# Altium footprint library EXPLORER.PcbLib: 252 footprints (part 10 of 16)
Each footprint in its own frame and in the unit in brackets; x right, y up, seen from the top. Pads: shape width x height; smd on the part's side, far side on the other; paste and mask are expansions set on the pad; w line width, h text height; cw(c..) or ccw(c..) is an arc to the next point about the centre after c.
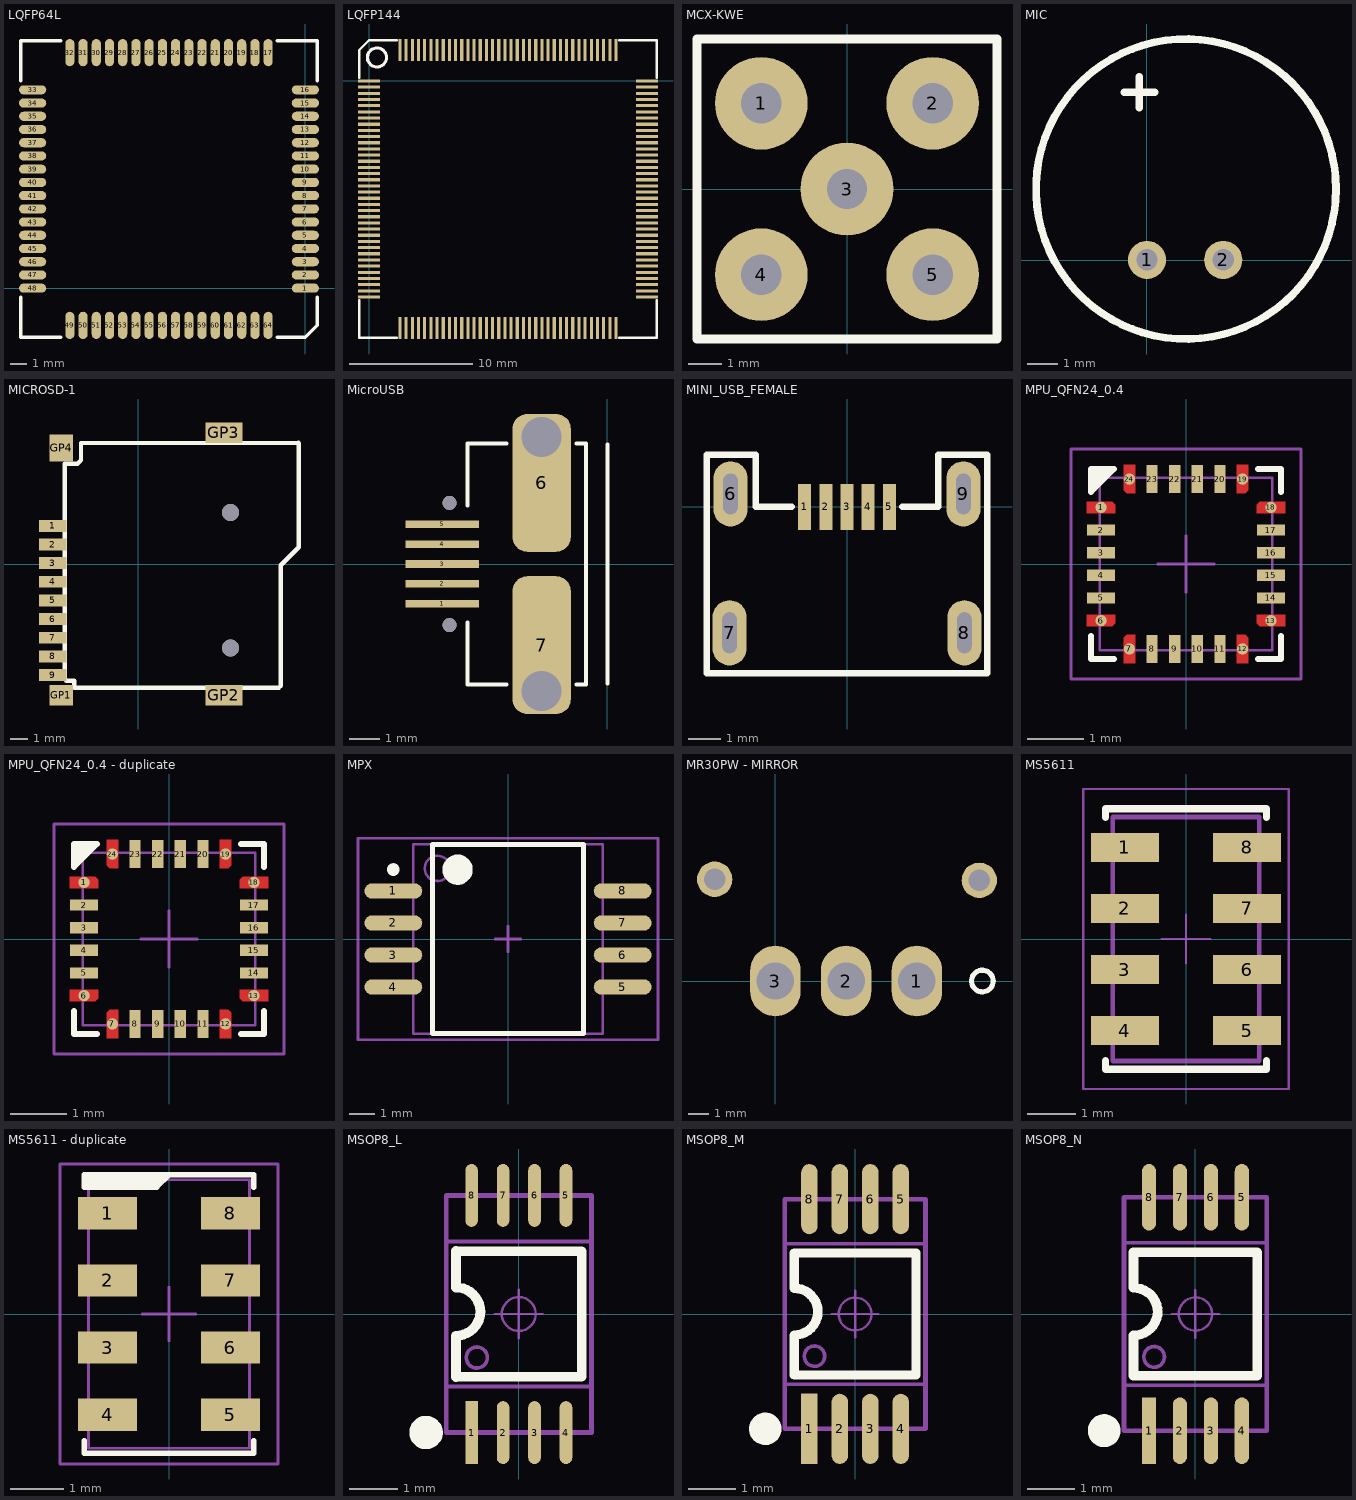
[diagram p9: the footprints below, top view; thin cyan lines are the x and y axes]

## LQFP64L [mm]
height 1.6
pads (64):
  oval 1.65x0.55 smd: 1(0,0) 2(0,0.8) 3(0,1.6) 4(0,2.4) 5(0,3.2) 6(0,4) 7(0,4.8) 8(0,5.6) 9(0,6.4) 10(0,7.2) 11(0,8) 12(0,8.8) 13(0,9.6) 14(0,10.4) 15(0,11.2) 16(0,12) 33(-16.5,12) 34(-16.5,11.2) 35(-16.5,10.4) 36(-16.5,9.6) 37(-16.5,8.8) 38(-16.5,8) 39(-16.5,7.2) 40(-16.5,6.4) 41(-16.5,5.6) 42(-16.5,4.8) 43(-16.5,4) 44(-16.5,3.2) 45(-16.5,2.4) 46(-16.5,1.6) 47(-16.5,0.8) 48(-16.5,0)
  oval 0.55x1.65 smd: 17(-2.25,14.25) 18(-3.05,14.25) 19(-3.85,14.25) 20(-4.65,14.25) 21(-5.45,14.25) 22(-6.25,14.25) 23(-7.05,14.25) 24(-7.85,14.25) 25(-8.65,14.25) 26(-9.45,14.25) 27(-10.25,14.25) 28(-11.05,14.25) 29(-11.85,14.25) 30(-12.65,14.25) 31(-13.45,14.25) 32(-14.25,14.25) 49(-14.25,-2.25) 50(-13.45,-2.25) 51(-12.65,-2.25) 52(-11.85,-2.25) 53(-11.05,-2.25) 54(-10.25,-2.25) 55(-9.45,-2.25) 56(-8.65,-2.25) 57(-7.85,-2.25) 58(-7.05,-2.25) 59(-6.25,-2.25) 60(-5.45,-2.25) 61(-4.65,-2.25) 62(-3.85,-2.25) 63(-3.05,-2.25) 64(-2.25,-2.25)
Top Overlay:
  lines w0.2: -17.225,-0.55 -17.225,-2.975 -14.8,-2.975 ; -17.225,12.55 -17.225,14.975 -14.8,14.975 ; -1.7,-2.975 0,-2.975 0.725,-2.25 0.725,-0.55 ; -1.7,14.975 0.725,14.975 0.725,12.55

## LQFP144 [mm]
pads (144):
  rect 1.8x0.254 smd: 1(-0.009,0.001) 2(-0.009,-0.499) 3(-0.009,-0.999) 4(-0.009,-1.499) 5(-0.009,-1.999) 6(-0.009,-2.499) 7(-0.009,-2.999) 8(-0.009,-3.499) 9(-0.009,-3.999) 10(-0.009,-4.499) 11(-0.009,-4.999) 12(-0.009,-5.499) 13(-0.009,-5.999) 14(-0.009,-6.499) 15(-0.009,-6.999) 16(-0.009,-7.499) 17(-0.009,-7.999) 18(-0.009,-8.499) 19(-0.009,-8.999) 20(-0.009,-9.499) 21(-0.009,-9.999) 22(-0.009,-10.499) 23(-0.009,-10.999) 24(-0.009,-11.499) 25(-0.009,-11.999) 26(-0.009,-12.499) 27(-0.009,-12.999) 28(-0.009,-13.499) 29(-0.009,-13.999) 30(-0.009,-14.499) 31(-0.009,-14.999) 32(-0.009,-15.499) 33(-0.009,-15.999) 34(-0.009,-16.499) 35(-0.009,-16.999) 36(-0.009,-17.499) 73(22.491,-17.499) 74(22.491,-16.999) 75(22.491,-16.499) 76(22.491,-15.999) 77(22.491,-15.499) 78(22.491,-14.999) 79(22.491,-14.499) 80(22.491,-13.999) 81(22.491,-13.499) 82(22.491,-12.999) 83(22.491,-12.499) 84(22.491,-11.999) 85(22.491,-11.499) 86(22.491,-10.999) 87(22.491,-10.499) 88(22.491,-9.999) 89(22.491,-9.499) 90(22.491,-8.999) 91(22.491,-8.499) 92(22.491,-7.999) 93(22.491,-7.499) 94(22.491,-6.999) 95(22.491,-6.499) 96(22.491,-5.999) 97(22.491,-5.499) 98(22.491,-4.999) 99(22.491,-4.499) 100(22.491,-3.999) 101(22.491,-3.499) 102(22.491,-2.999) 103(22.491,-2.499) 104(22.491,-1.999) 105(22.491,-1.499) 106(22.491,-0.999) 107(22.491,-0.499) 108(22.491,0.001)
  rect 0.254x1.8 smd: 37(2.491,-19.999) 38(2.991,-19.999) 39(3.491,-19.999) 40(3.991,-19.999) 41(4.491,-19.999) 42(4.991,-19.999) 43(5.491,-19.999) 44(5.991,-19.999) 45(6.491,-19.999) 46(6.991,-19.999) 47(7.491,-19.999) 48(7.991,-19.999) 49(8.491,-19.999) 50(8.991,-19.999) 51(9.491,-19.999) 52(9.991,-19.999) 53(10.491,-19.999) 54(10.991,-19.999) 55(11.491,-19.999) 56(11.991,-19.999) 57(12.491,-19.999) 58(12.991,-19.999) 59(13.491,-19.999) 60(13.991,-19.999) 61(14.491,-19.999) 62(14.991,-19.999) 63(15.491,-19.999) 64(15.991,-19.999) 65(16.491,-19.999) 66(16.991,-19.999) 67(17.491,-19.999) 68(17.991,-19.999) 69(18.491,-19.999) 70(18.991,-19.999) 71(19.491,-19.999) 72(19.991,-19.999) 109(19.991,2.501) 110(19.491,2.501) 111(18.991,2.501) 112(18.491,2.501) 113(17.991,2.501) 114(17.491,2.501) 115(16.991,2.501) 116(16.491,2.501) 117(15.991,2.501) 118(15.491,2.501) 119(14.991,2.501) 120(14.491,2.501) 121(13.991,2.501) 122(13.491,2.501) 123(12.991,2.501) 124(12.491,2.501) 125(11.991,2.501) 126(11.491,2.501) 127(10.991,2.501) 128(10.491,2.501) 129(9.991,2.501) 130(9.491,2.501) 131(8.991,2.501) 132(8.491,2.501) 133(7.991,2.501) 134(7.491,2.501) 135(6.991,2.501) 136(6.491,2.501) 137(5.991,2.501) 138(5.491,2.501) 139(4.991,2.501) 140(4.491,2.501) 141(3.991,2.501) 142(3.491,2.501) 143(2.991,2.501) 144(2.491,2.501)
Top Overlay:
  circle w0.254: c0.624,1.905 r0.773
  lines w0.2: -0.809,-17.749 -0.809,-20.799 2.241,-20.799 ; -0.809,0.251 -0.809,2.501 -0.009,3.301 2.241,3.301 ; 20.241,-20.799 23.291,-20.799 23.291,-17.749 ; 20.241,3.301 23.291,3.301 23.291,0.251

## MCX-KWE [mm]
height 1.75
pads (5):
  round 2.75 hole 1.2: 1(-2.54,2.54) 2(2.54,2.54) 3(0,0) 4(-2.54,-2.54) 5(2.54,-2.54)
Top Overlay:
  lines w0.254: -4.445,-4.445 4.445,-4.445 4.445,4.445 -4.445,4.445 -4.445,-4.445

## MIC [mil]
pads (2):
  round 50 hole 28: 1(0.42,0.29) 2(100.42,0.29)
Top Overlay:
  circle w10: c51.58,93.29 r196.85
  lines w10: -29.58,220.29 10.42,220.29 ; -9.58,200.29 -9.58,240.29

## MICROSD-1 [mm]
height 2
pads (13):
  rect 1.6x0.7 smd: 1(-5.05,2.25) 2(-5.05,1.15) 3(-5.05,0.05) 4(-5.05,-1.05) 5(-5.05,-2.15) 6(-5.05,-3.25) 7(-5.05,-4.35) 8(-5.05,-5.45) 9(-5.05,-6.55)
  rect 1.4x1.2 smd: GP1(-4.55,-7.75)
  rect 2.2x1.2 smd: GP2(5.05,-7.75) GP3(5.05,7.75)
  rect 1.4x1.6 smd: GP4(-4.55,6.85)
via 5.45,3.05 diameter 1 hole 1
via 5.45,-4.95 diameter 1 hole 1
Top Overlay:
  lines w0.254: 9.45,7.15 -3.383,7.134 -3.383,6.118 -3.586,5.915 -4.348,5.915 -4.348,-6.785 -4.246,-6.886 -3.789,-6.886 -3.789,-7.293 8.301,-7.293 8.403,-7.191 8.403,-0.079 9.47,0.988 9.47,7.13

## MicroUSB [mm]
pads (9):
  rect 2.4x0.25 smd: 1(-5.4,-1.3) 2(-5.4,-0.65) 3(-5.4,0) 4(-5.4,0.65) 5(-5.4,1.3)
  rrect50% 1.9x4.5 smd: 6(-2.15,2.65) 7(-2.15,-2.65)
  round 0.457 hole 0.457 unplated: ""(-5.159,-2) ""(-5.159,2)
via -2.159,4.15 diameter 1.5 hole 1.3
via -2.159,-4.15 diameter 1.5 hole 1.3
Top Overlay:
  lines w0.127: -4.572,-1.905 -4.572,-3.937 -3.302,-3.937 ; -4.572,1.905 -4.572,3.937 -3.302,3.937 ; -1.016,-3.937 -0.7,-3.937 ; -1.016,3.937 -0.7,3.937 ; -0.7,-3.9 -0.7,3.9 ; 0,-3.9 0,3.9

## MINI_USB_FEMALE [mm]
pads (9):
  rect 0.4x1.4 smd: 1(-1.3,0) 2(-0.65,0) 3(0,0) 4(0.65,0) 5(1.3,0)
  oval 1.05x2 hole 0.45 slot 1.25 at 90 deg: 6(-3.57,0.4) 7(-3.6,-3.86) 8(3.6,-3.86) 9(3.57,0.4)
Top Overlay:
  lines w0.05: 3.2,-3.86 3.94,-3.86
  lines w0.2: -1.7,0 -2.8,0 -2.8,1.6 -4.3,1.6 -4.3,-5.1 4.3,-5.1 4.3,1.6 2.8,1.6 2.8,0 1.7,0

## MPU_QFN24_0.4 [mm] "QFN, 24-Leads, Body 3.00x3.00mm, Pitch 0.40mm, Thermal Pad 1.54x1.70mm, IPC Medium Density"
height 1
pads (24):
  round 0.2 smd mask+0: 1(-1.5,1) 6(-1.5,-1) 7(-1,-1.5) 12(1,-1.5) 13(1.5,-1) 18(1.5,1) 19(1,1.5) 24(-1,1.5)
  rect 0.5x0.2 smd mask+0.025: 2(-1.5,0.6) 3(-1.5,0.2) 4(-1.5,-0.2) 5(-1.5,-0.6) 14(1.5,-0.6) 15(1.5,-0.2) 16(1.5,0.2) 17(1.5,0.6)
  rect 0.2x0.5 smd mask+0.025: 8(-0.6,-1.5) 9(-0.2,-1.5) 10(0.2,-1.5) 11(0.6,-1.5) 20(0.6,1.5) 21(0.2,1.5) 22(-0.2,1.5) 23(-0.6,1.5)
Top Layer:
  region: -0.9,1.75 -0.9,1.25 -1.05,1.25 -1.1,1.3 -1.1,1.75
  region: -1.75,1.1 -1.3,1.1 -1.25,1.05 -1.25,0.9 -1.75,0.9
  region: -1.1,-1.75 -1.1,-1.3 -1.05,-1.25 -0.9,-1.25 -0.9,-1.75
  region: -1.75,-0.9 -1.25,-0.9 -1.25,-1.05 -1.3,-1.1 -1.75,-1.1
  region: 1.75,-1.1 1.3,-1.1 1.25,-1.05 1.25,-0.9 1.75,-0.9
  region: 0.9,-1.75 0.9,-1.25 1.05,-1.25 1.1,-1.3 1.1,-1.75
  region: 1.1,1.75 1.1,1.3 1.05,1.25 0.9,1.25 0.9,1.75
  region: 1.75,0.9 1.25,0.9 1.25,1.05 1.3,1.1 1.75,1.1
Top Overlay:
  region: -1.676,1.676 -1.27,1.676 -1.676,1.27
  lines w0.102: -1.676,-1.27 -1.676,-1.676 -1.27,-1.676 ; 1.27,-1.676 1.676,-1.676 1.676,-1.27 ; 1.27,1.676 1.676,1.676 1.676,1.27 ; -1.676,1.27 -1.27,1.676 -1.676,1.676 -1.676,1.27
Top Solder:
  region: -1.8,1.15 -1.8,-1.15 -1.2,-1.15 -1.2,1.15
  rectangle: -1.15,1.2 1.15,1.8
  region: 1.2,1.15 1.2,-1.15 1.8,-1.15 1.8,1.15
  rectangle: -1.15,-1.8 1.15,-1.2
  region: -0.875,1.775 -0.875,1.225 -1.061,1.225 -1.125,1.289 -1.125,1.775
  region: -1.775,1.125 -1.289,1.125 -1.225,1.061 -1.225,0.875 -1.775,0.875
  region: -1.125,-1.775 -1.125,-1.289 -1.061,-1.225 -0.875,-1.225 -0.875,-1.775
  region: -1.775,-0.875 -1.225,-0.875 -1.225,-1.061 -1.289,-1.125 -1.775,-1.125
  region: 1.775,-1.125 1.289,-1.125 1.225,-1.061 1.225,-0.875 1.775,-0.875
  region: 0.875,-1.775 0.875,-1.225 1.061,-1.225 1.125,-1.289 1.125,-1.775
  region: 1.125,1.775 1.125,1.289 1.061,1.225 0.875,1.225 0.875,1.775
  region: 1.775,0.875 1.225,0.875 1.225,1.061 1.289,1.125 1.775,1.125
Mechanical 13:
  lines w0.051: -1.524,-1.524 -1.524,1.524 1.524,1.524 1.524,-1.524 -1.524,-1.524
Mechanical 15:
  lines w0.051: -0.5,0 0.5,0 ; 0,-0.5 0,0.5 ; -2.032,-2.032 -2.032,2.032 2.032,2.032 2.032,-2.032 -2.032,-2.032
3D body: height 0.9, standoff 0, extent -1.501,-1.501 1.501,1.501

## MPU_QFN24_0.4 - duplicate [mm] "QFN, 24-Leads, Body 3.00x3.00mm, Pitch 0.40mm, Thermal Pad 1.54x1.70mm, IPC Medium Density"
height 1
pads (24):
  round 0.2 smd mask+0: 1(-1.5,1) 6(-1.5,-1) 7(-1,-1.5) 12(1,-1.5) 13(1.5,-1) 18(1.5,1) 19(1,1.5) 24(-1,1.5)
  rect 0.5x0.2 smd mask+0.025: 2(-1.5,0.6) 3(-1.5,0.2) 4(-1.5,-0.2) 5(-1.5,-0.6) 14(1.5,-0.6) 15(1.5,-0.2) 16(1.5,0.2) 17(1.5,0.6)
  rect 0.2x0.5 smd mask+0.025: 8(-0.6,-1.5) 9(-0.2,-1.5) 10(0.2,-1.5) 11(0.6,-1.5) 20(0.6,1.5) 21(0.2,1.5) 22(-0.2,1.5) 23(-0.6,1.5)
Top Layer:
  region: -0.9,1.75 -0.9,1.25 -1.05,1.25 -1.1,1.3 -1.1,1.75
  region: -1.75,1.1 -1.3,1.1 -1.25,1.05 -1.25,0.9 -1.75,0.9
  region: -1.1,-1.75 -1.1,-1.3 -1.05,-1.25 -0.9,-1.25 -0.9,-1.75
  region: -1.75,-0.9 -1.25,-0.9 -1.25,-1.05 -1.3,-1.1 -1.75,-1.1
  region: 1.75,-1.1 1.3,-1.1 1.25,-1.05 1.25,-0.9 1.75,-0.9
  region: 0.9,-1.75 0.9,-1.25 1.05,-1.25 1.1,-1.3 1.1,-1.75
  region: 1.1,1.75 1.1,1.3 1.05,1.25 0.9,1.25 0.9,1.75
  region: 1.75,0.9 1.25,0.9 1.25,1.05 1.3,1.1 1.75,1.1
Top Overlay:
  region: -1.676,1.676 -1.27,1.676 -1.676,1.27
  lines w0.102: -1.676,-1.27 -1.676,-1.676 -1.27,-1.676 ; 1.27,-1.676 1.676,-1.676 1.676,-1.27 ; 1.27,1.676 1.676,1.676 1.676,1.27 ; -1.676,1.27 -1.27,1.676 -1.676,1.676 -1.676,1.27
Top Solder:
  region: -1.8,1.15 -1.8,-1.15 -1.2,-1.15 -1.2,1.15
  rectangle: -1.15,1.2 1.15,1.8
  region: 1.2,1.15 1.2,-1.15 1.8,-1.15 1.8,1.15
  rectangle: -1.15,-1.8 1.15,-1.2
  region: -0.875,1.775 -0.875,1.225 -1.061,1.225 -1.125,1.289 -1.125,1.775
  region: -1.775,1.125 -1.289,1.125 -1.225,1.061 -1.225,0.875 -1.775,0.875
  region: -1.125,-1.775 -1.125,-1.289 -1.061,-1.225 -0.875,-1.225 -0.875,-1.775
  region: -1.775,-0.875 -1.225,-0.875 -1.225,-1.061 -1.289,-1.125 -1.775,-1.125
  region: 1.775,-1.125 1.289,-1.125 1.225,-1.061 1.225,-0.875 1.775,-0.875
  region: 0.875,-1.775 0.875,-1.225 1.061,-1.225 1.125,-1.289 1.125,-1.775
  region: 1.125,1.775 1.125,1.289 1.061,1.225 0.875,1.225 0.875,1.775
  region: 1.775,0.875 1.225,0.875 1.225,1.061 1.289,1.125 1.775,1.125
Mechanical 13:
  lines w0.051: -1.524,-1.524 -1.524,1.524 1.524,1.524 1.524,-1.524 -1.524,-1.524
Mechanical 15:
  lines w0.051: -0.5,0 0.5,0 ; 0,-0.5 0,0.5 ; -2.032,-2.032 -2.032,2.032 2.032,2.032 2.032,-2.032 -2.032,-2.032
3D body: height 0.9, standoff 0, extent -1.501,-1.501 1.501,1.501

## MPX [mm] "SOP, 8-Leads, Body 7.5x7.5mm (max), Pitch 1.27mm, IPC Medium Density"
height 2.65
pads (8):
  oval 2.3x0.6 smd: 1(-4.55,1.905) 2(-4.55,0.635) 3(-4.55,-0.635) 4(-4.55,-1.905) 5(4.55,-1.905) 6(4.55,-0.635) 7(4.55,0.635) 8(4.55,1.905)
Top Overlay:
  circle w0.6: c-2,2.75 r0.3
  circle w0.25: c-4.55,2.755 r0.125
  lines w0.2: -3,-3.75 3,-3.75 3,3.75 -3,3.75 -3,-3.75
Mechanical 13:
  circle w0.1: c-2.8,2.8 r0.5
  lines w0.1: -3.75,-3.75 3.75,-3.75 3.75,3.75 -3.75,3.75 -3.75,-3.75
Mechanical 15:
  lines w0.1: -0.5,0 0.5,0 ; 0,-0.5 0,0.5 ; -5.95,-4 5.95,-4 5.95,4 -5.95,4 -5.95,-4
3D body: height 2.65, standoff 0.1, extent -3.75,-3.75 3.75,3.75

## MR30PW - MIRROR [mm]
pads (5):
  oval 2.5x3.5 hole 1.85: 1(7,0) 2(3.5,0) 3(0,0)
  round 1.75 hole 1.05: ""(-2.997,5.029) ""(10.084,4.978)
Top Overlay:
  circle w0.254: c10.236,0 r0.536
3D body: height 4.91, standoff -2.05, extent -4.5,-0.914 11.51,13.575

## MS5611 [mm] "QFN, 8-Leads, Body 5.00x3.00mm, Pitch 1.25mm/0.00mm, Thermal Pad 4.35x0.00mm, IPC Medium Density"
height 1
pads (8):
  rect 1.4x0.6 smd: 1(-1.25,1.875) 2(-1.25,0.625) 3(-1.25,-0.625) 4(-1.25,-1.875) 5(1.25,-1.875) 6(1.25,-0.625) 7(1.25,0.625) 8(1.25,1.875)
Top Overlay:
  lines w0.152: -1.65,-2.489 -1.65,-2.667 1.65,-2.667 1.65,-2.489 ; -1.65,2.489 -1.65,2.667 1.65,2.667 1.65,2.489
Mechanical 13:
  lines w0.1: -1.5,-2.5 -1.5,2.5 1.5,2.5 1.5,-2.5 -1.5,-2.5
Mechanical 15:
  lines w0.051: -0.5,0 0.5,0 ; 0,-0.5 0,0.5 ; -2.108,-3.073 -2.108,3.073 2.108,3.073 2.108,-3.073 -2.108,-3.073
3D body: height 1, standoff 0, extent -1.6,-2.5 1.6,2.5

## MS5611 - duplicate [mm]
height 1
pads (8):
  rect 1.1x0.6 smd: 1(-1.143,1.875) 2(-1.143,0.625) 3(-1.143,-0.625) 4(-1.143,-1.875) 5(1.143,-1.875) 6(1.143,-0.625) 7(1.143,0.625) 8(1.143,1.875)
Top Overlay:
  region: -1.575,2.591 0,2.591 -0.229,2.362 -1.575,2.362
  lines w0.102: -1.575,-2.362 -1.575,-2.591 1.575,-2.591 1.575,-2.362 ; 0,2.591 -0.229,2.362 -1.575,2.362 -1.575,2.591 1.575,2.591 1.575,2.362
Mechanical 13:
  lines w0.051: -1.5,-2.5 1.5,-2.5 1.5,2.5 -1.5,2.5 -1.5,-2.5
Mechanical 15:
  lines w0.051: -0.5,0 0.5,0 ; 0,-0.5 0,0.5 ; -2.032,-2.794 2.032,-2.794 2.032,2.794 -2.032,2.794 -2.032,-2.794
3D body: height 1, standoff 0, extent -1.6,-2.5 1.6,2.5

## MSOP8_L [mm] "塑封体长3mm，宽3mm，脚距0.65"
pads (8):
  rect 0.26x1.3 smd: 1(-0.975,-2.45)
  oval 0.26x1.3 smd: 2(-0.325,-2.45) 3(0.325,-2.45) 4(0.975,-2.45) 5(0.975,2.45) 6(0.325,2.45) 7(-0.325,2.45) 8(-0.975,2.45)
Top Overlay:
  circle w0.381: c-1.917,-2.45 r0.155
  lines w0.2: -1.3,-1.3 1.3,-1.3 1.3,1.3 -1.3,1.3
  lines w0.203: -1.3,-1.3 -1.3,-0.46 ; -1.3,-0.45 ccw(c-1.3,0.058) -0.792,0.058 ; -1.3,0.55 cw(c-1.3,0.042) -0.792,0.042 ; -1.3,0.556 -1.3,1.3
Mechanical 13:
  circle w0.076: c-0.867,-0.9 r0.217
  lines w0.076: -1.5,-1.5 1.5,-1.5 1.5,1.5 -1.5,1.5 -1.5,-1.5
Mechanical 15:
  circle w0.05: c0,0 r0.35
  lines w0.05: -0.5,0 0.5,0 ; 0,-0.5 0,0.5
  lines w0.1: -1.5,-2.45 -1.5,2.45 1.5,2.45 1.5,-2.45 -1.5,-2.45
3D body: height 0.95, standoff 0, extent -1.5,-2.45 1.5,2.45

## MSOP8_M [mm] "塑封体长3mm，宽3mm，脚距0.65"
pads (8):
  rect 0.35x1.5 smd: 1(-0.975,-2.45)
  oval 0.35x1.5 smd: 2(-0.325,-2.45) 3(0.325,-2.45) 4(0.975,-2.45) 5(0.975,2.45) 6(0.325,2.45) 7(-0.325,2.45) 8(-0.975,2.45)
Top Overlay:
  circle w0.381: c-1.917,-2.45 r0.155
  lines w0.2: -1.3,-1.3 1.3,-1.3 1.3,1.3 -1.3,1.3
  lines w0.203: -1.3,-1.3 -1.3,-0.46 ; -1.3,-0.45 ccw(c-1.3,0.058) -0.792,0.058 ; -1.3,0.55 cw(c-1.3,0.042) -0.792,0.042 ; -1.3,0.556 -1.3,1.3
Mechanical 13:
  circle w0.076: c-0.867,-0.9 r0.217
  lines w0.076: -1.5,-1.5 1.5,-1.5 1.5,1.5 -1.5,1.5 -1.5,-1.5
Mechanical 15:
  circle w0.05: c0,0 r0.35
  lines w0.05: -0.5,0 0.5,0 ; 0,-0.5 0,0.5
  lines w0.1: -1.5,-2.45 -1.5,2.45 1.5,2.45 1.5,-2.45 -1.5,-2.45
3D body: height 0.95, standoff 0, extent -1.5,-2.45 1.5,2.45

## MSOP8_N [mm] "塑封体长3mm，宽3mm，脚距0.65"
pads (8):
  rect 0.3x1.4 smd: 1(-0.975,-2.45)
  oval 0.3x1.4 smd: 2(-0.325,-2.45) 3(0.325,-2.45) 4(0.975,-2.45) 5(0.975,2.45) 6(0.325,2.45) 7(-0.325,2.45) 8(-0.975,2.45)
Top Overlay:
  circle w0.381: c-1.917,-2.45 r0.155
  lines w0.2: -1.3,-1.3 1.3,-1.3 1.3,1.3 -1.3,1.3
  lines w0.203: -1.3,-1.3 -1.3,-0.46 ; -1.3,-0.45 ccw(c-1.3,0.058) -0.792,0.058 ; -1.3,0.55 cw(c-1.3,0.042) -0.792,0.042 ; -1.3,0.556 -1.3,1.3
Mechanical 13:
  circle w0.076: c-0.867,-0.9 r0.217
  lines w0.076: -1.5,-1.5 1.5,-1.5 1.5,1.5 -1.5,1.5 -1.5,-1.5
Mechanical 15:
  circle w0.05: c0,0 r0.35
  lines w0.05: -0.5,0 0.5,0 ; 0,-0.5 0,0.5
  lines w0.1: -1.5,-2.45 -1.5,2.45 1.5,2.45 1.5,-2.45 -1.5,-2.45
3D body: height 0.95, standoff 0, extent -1.5,-2.45 1.5,2.45